# Altium footprint library common.PcbLib: 552 footprints (part 2 of 35)
Each footprint in its own frame and in the unit in brackets; x right, y up, seen from the top. Pads: shape width x height; smd on the part's side, far side on the other; paste and mask are expansions set on the pad; w line width, h text height; cw(c..) or ccw(c..) is an arc to the next point about the centre after c.
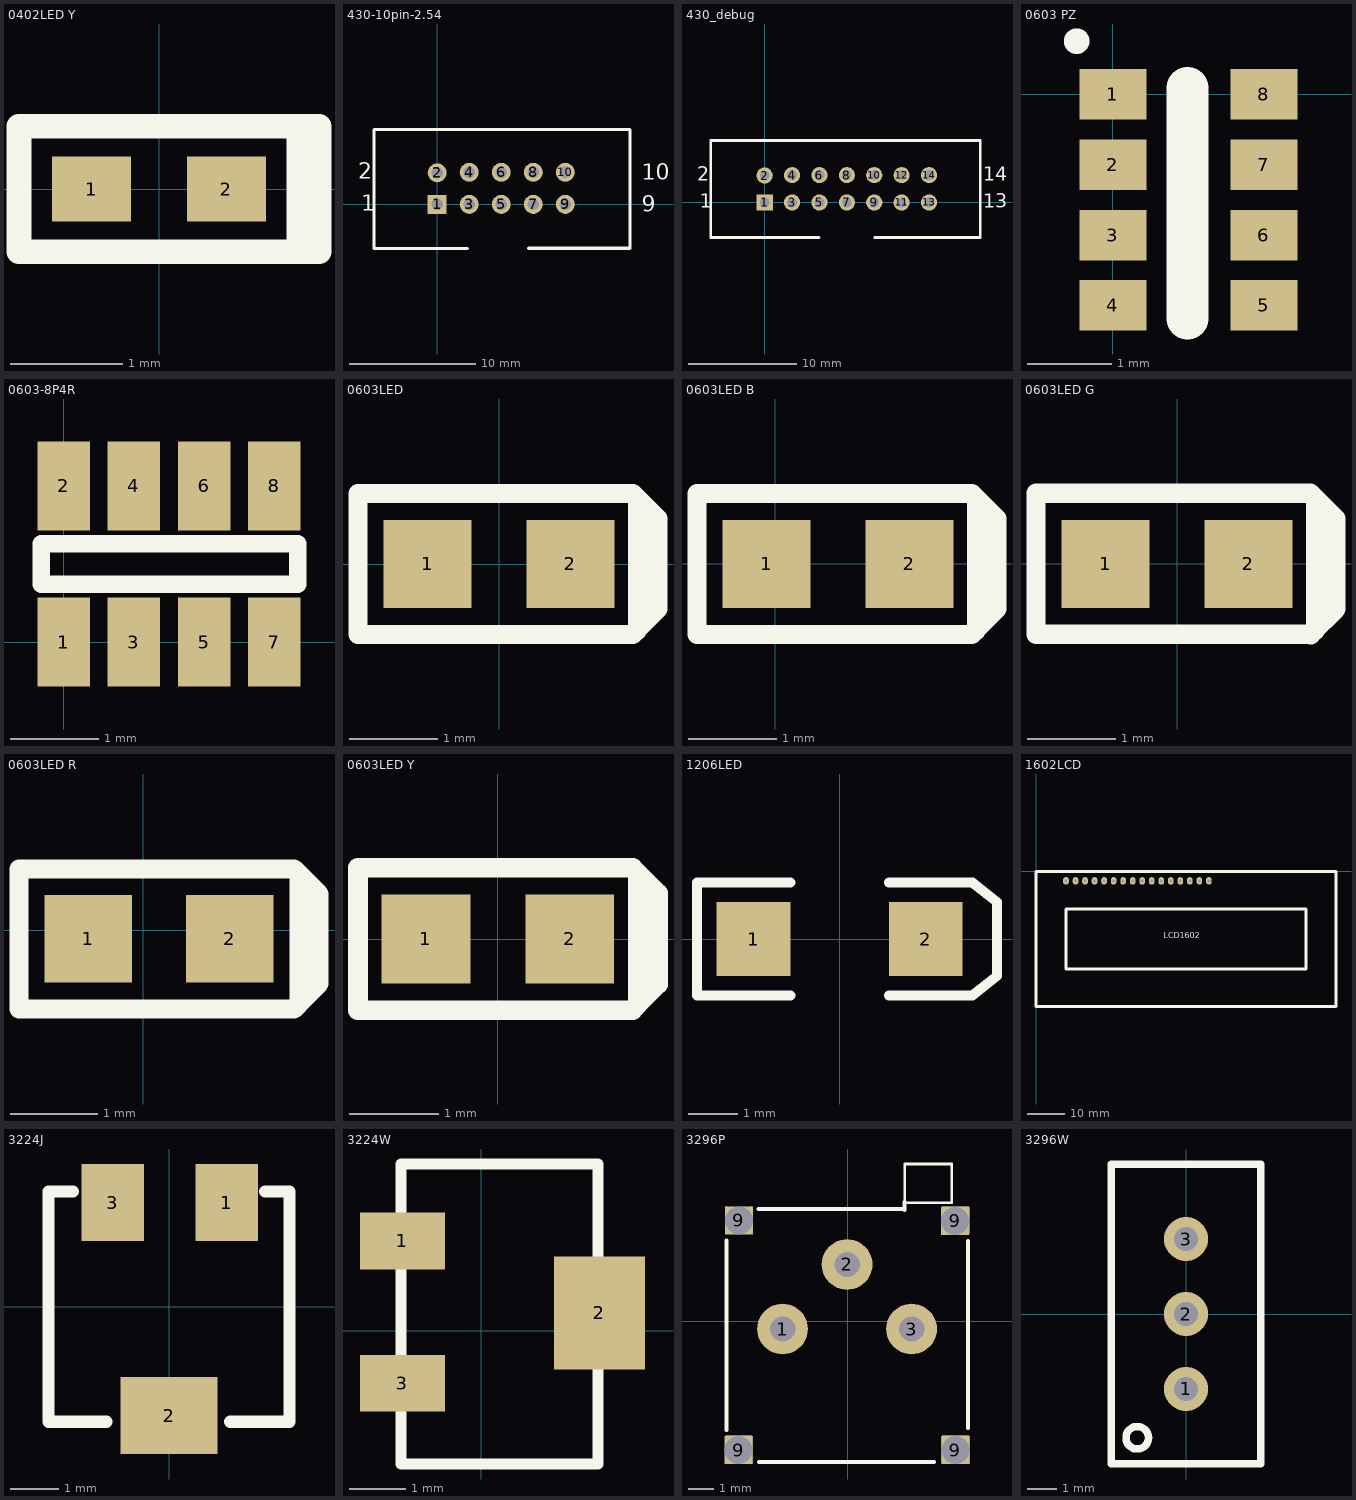
[diagram p1: the footprints below, top view; thin cyan lines are the x and y axes]

## 0402LED Y [mm]
pads (2):
  rect 0.7x0.58 smd: 1(-0.6,0) 2(0.6,0)
Top Overlay:
  lines w0.22: 1.245,-0.559 1.245,0.559 ; 1.245,-0.559 -1.245,-0.559 -1.245,0.559 1.245,0.559 ; 1.245,-0.559 1.422,-0.559 1.422,0.559 1.245,0.559 ; 1.245,-0.559 1.245,0.559
3D body: height 0.45, standoff 0, extent -0.505,-0.25 0.505,0.25

## 430-10pin-2.54 [mm] "牛角座"
pads (10):
  rect 1.5x1.5 hole 0.9: 1(0,0)
  round 1.5 hole 0.9: 2(0,2.5) 3(2.54,0) 4(2.54,2.54) 5(5.08,0) 6(5.08,2.54) 7(7.62,0) 8(7.62,2.54) 9(10.16,0) 10(10.16,2.54)
Top Overlay:
  lines w0.254: 2.388,-3.505 -5,-3.505 -5,5.944 15.291,5.944 15.291,-3.48 7.264,-3.48
  text "9" at 16.233,-0.584 h1.27
  text "10" at 16.233,1.956 h1.27
  text "1" at -6,-0.5 h1.27
  text "2" at -6.274,2.032 h1.27
3D body: height 9.86, standoff -3.05, extent -5.055,-3.353 15.265,5.791

## 430_debug [mm] "msp430调试接口（未加焊）"
pads (14):
  rect 1.5x1.5 hole 0.9: 1(0,0)
  round 1.5 hole 0.9: 2(0,2.5) 3(2.54,0) 4(2.54,2.54) 5(5.08,0) 6(5.08,2.54) 7(7.62,0) 8(7.62,2.54) 9(10.16,0) 10(10.16,2.54) 11(12.7,0) 12(12.7,2.54) 13(15.24,0) 14(15.24,2.54)
Top Overlay:
  lines w0.254: 5.028,-3.25 -5,-3.25 -5,5.75 20,5.75 20,-3.25 10.212,-3.25
  text "2" at -6.274,2.032 h1.27
  text "1" at -6,-0.5 h1.27
  text "14" at 20.272,2.032 h1.27
  text "13" at 20.272,-0.508 h1.27
3D body: height 8.67, standoff -3.41, extent -5.05,-3.295 20.29,5.545

## 0603 PZ [mm]
pads (8):
  rect 0.8x0.6 smd: 1(0,0) 2(0,-0.838) 3(0,-1.676) 4(0,-2.514) 5(1.8,-2.514) 6(1.8,-1.676) 7(1.8,-0.838) 8(1.8,0)
Top Overlay:
  circle w0.254: c-0.432,0.635 r0.025
  lines w0.5: 0.889,-2.667 0.889,0.076
3D body: height 0.55, standoff 0, extent 0.089,-2.87 1.689,0.33

## 0603-8P4R [mm]
pads (8):
  rect 0.6x1.016 smd: 1(0,0) 2(0,1.778) 3(0.8,0) 4(0.8,1.778) 5(1.6,0) 6(1.6,1.778) 7(2.4,0) 8(2.4,1.778)
Top Overlay:
  lines w0.2: -0.254,0.66 -0.254,1.118 2.667,1.118 2.667,0.66 -0.254,0.66
3D body: height 0.59, standoff 0.01, extent -0.381,0.102 2.819,1.702

## 0603LED [mm]
pads (2):
  rect 1x1 smd: 1(-0.81,0) 2(0.81,0)
Top Overlay:
  lines w0.22: 1.517,0.8 1.803,0.513 1.803,-0.508 1.517,-0.795 1.517,-0.8 ; 1.676,-0.559 1.676,0.559 ; 1.517,-0.8 1.575,-0.742 1.575,0.737 1.511,0.8 -1.6,0.8 -1.6,-0.8 1.517,-0.8
3D body: height 0.6, standoff 0, extent -0.81,-0.4 0.81,0.4

## 0603LED B [mm]
pads (2):
  rect 1x1 smd: 1(-0.099,0) 2(1.521,0)
Top Overlay:
  lines w0.22: 2.228,0.8 2.515,0.513 2.515,-0.508 2.228,-0.795 2.228,-0.8 ; 2.388,-0.559 2.388,0.559 ; 2.228,-0.8 -0.889,-0.8 -0.889,0.8 2.223,0.8 2.286,0.737 2.286,-0.742 2.228,-0.8
3D body: height 0.6, standoff 0, extent -0.099,-0.4 1.521,0.4

## 0603LED G [mm]
pads (2):
  rect 1x1 smd: 1(-0.81,0) 2(0.81,0)
Top Overlay:
  lines w0.22: 1.511,0.797 1.575,0.734 1.575,-0.744 1.517,-0.803 1.517,-0.797 1.803,-0.511 1.803,0.511 1.517,0.797 ; 1.511,0.8 -1.6,0.8 -1.6,-0.8 1.517,-0.8 ; 1.676,-0.561 1.676,0.556
3D body: height 0.6, standoff 0, extent -0.81,-0.4 0.81,0.4

## 0603LED R [mm]
pads (2):
  rect 1x1 smd: 1(-0.632,-0.101) 2(0.988,-0.101)
Top Overlay:
  lines w0.22: 1.72,0.698 2.007,0.412 2.007,-0.61 1.72,-0.896 1.72,-0.902 ; 1.88,-0.66 1.88,0.457 ; 1.72,-0.902 1.778,-0.843 1.778,0.635 1.715,0.698 -1.422,0.698 -1.422,-0.902 1.72,-0.902
3D body: height 0.6, standoff 0, extent -0.632,-0.501 0.988,0.299

## 0603LED Y [mm]
pads (2):
  rect 1x1 smd: 1(-0.81,0) 2(0.81,0)
Top Overlay:
  lines w0.22: 1.517,0.8 1.803,0.513 1.803,-0.508 1.517,-0.795 1.517,-0.8 ; 1.676,-0.559 1.676,0.559 ; 1.517,-0.8 -1.575,-0.8 -1.575,0.8 1.511,0.8 1.575,0.737 1.575,-0.742 1.517,-0.8
3D body: height 0.6, standoff 0, extent -0.81,-0.4 0.81,0.4

## 1206LED [mm] "SMT LED; 2 Flat Leads"
height 1.2
pads (2):
  rect 1.5x1.5 smd: 1(-1.75,0) 2(1.75,0)
Top Overlay:
  lines w0.2: -1,-1.15 -2.9,-1.15 -2.9,1.15 -1,1.15 ; 1,-1.15 2.7,-1.15 3.2,-0.75 3.2,0.75 2.7,1.15 1,1.15
3D body: height 1.5, standoff 0, extent -2.7,-1.016 2.7,0.984

## 1602LCD [mil] "LCD module 16*2 char"
pads (16):
  oval 60x80 hole 30: 1(314.96,-98.43) 2(414.96,-98.43) 3(514.96,-98.43) 4(614.96,-98.43) 5(714.96,-98.43) 6(814.96,-98.43) 7(914.96,-98.43) 8(1014.96,-98.43) 9(1114.96,-98.43) 10(1214.96,-98.43) 11(1314.96,-98.43) 12(1414.96,-98.43) 13(1514.96,-98.43) 14(1614.96,-98.43) 15(1714.96,-98.43) 16(1814.96,-98.43)
Top Overlay:
  lines w30: 0,-1417.32 3149.61,-1417.32 3149.61,0 0,0 0,-1417.32 ; 314.96,-1023.62 2834.65,-1023.62 2834.65,-393.7 314.96,-393.7 314.96,-1023.62
  text "LCD1602" at 1340,-700 h60
3D body: height 354.33, standoff -145.67, extent -5.8,-1401.95 3143.8,-24

## 3224J [mil]
pads (3):
  rect 51x63 smd mask+4: 1(47,85) 3(-46,85)
  rect 79x63 smd mask+4: 2(0,-89)
Top Overlay:
  lines w10: -78.5,94 -98.5,94 -98.5,-94 -51,-94 ; 50,-94 98.5,-94 98.5,94 78.5,94
3D body: height 138.19, standoff -7.87, extent -93.98,-99.42 94.99,97.43

## 3224W [mm]
pads (3):
  rect 1.5x1 smd: 1(-1.397,1.583) 3(-1.397,-0.932)
  rect 1.6x2 smd: 2(2.083,0.313)
Top Overlay:
  lines w0.2: -1.422,-2.354 2.057,-2.354 2.057,2.942 -1.422,2.942 -1.422,-2.354
Mechanical 2:
  text "+" at -0.203,0.63 h0.76
3D body: height 5.29, standoff 0, extent -1.627,-2.134 2.311,2.692

## 3296P [mm]
pads (7):
  round 2 hole 1: 1(-2.558,-0.302) 2(-0.018,2.238) 3(2.522,-0.302)
  rect 1.1x1.1 hole 1.1 square: 9(-4.285,-5.066) 9(-4.28,3.97) 9(4.237,3.952) 9(4.243,-5.066)
Top Overlay:
  lines w0.1: -4.783,4.461 -4.783,3.481 -3.783,3.481 -3.783,4.461 ; 2.254,4.673 3.254,4.673 ; -4.783,-5.569 -3.783,-5.569 -3.783,-4.549 -4.783,-4.549 -4.783,-5.569 ; 2.246,4.673 4.111,4.673 4.111,6.193 2.246,6.193 2.246,4.673 ; 3.747,-5.569 4.747,-5.569 4.747,-4.549 3.747,-4.549 3.747,-5.569 ; 3.747,3.481 4.747,3.481 4.747,4.461 3.747,4.461 3.747,3.481
  lines w0.152: -4.765,-4.285 -4.765,3.184 ; -3.504,4.424 2.233,4.424 ; -3.481,-5.538 3.416,-5.538 ; 2.24,4.39 2.24,4.699 ; 4.745,-4.208 4.745,3.168
Mechanical 11:
  circle w0.1: c-2.558,-0.339 r0.25
  circle w0.1: c2.522,-0.339 r0.25
  circle w0.1: c-0.018,2.201 r0.25
3D body: height 5.4, standoff -1.5, extent -4.782,-5.569 4.747,5.981

## 3296W [mm]
height 2.38
pads (3):
  round 1.5 hole 0.8: 1(0,-2.54) 2(0,0) 3(0,2.54)
Top Overlay:
  circle w0.254: c-1.651,-4.191 r0.381
  lines w0.254: -2.54,-5.08 -2.54,5.08 2.54,5.08 2.54,-5.08 -2.54,-5.08
3D body: height 11.55, standoff -6.4, extent -2.413,-4.765 2.418,4.765